# Altium footprint library Tomra_Cadstar_Footprints.PcbLib: 373 footprints (part 23 of 24)
Each footprint in its own frame and in the unit in brackets; x right, y up, seen from the top. Pads: shape width x height; smd on the part's side, far side on the other; paste and mask are expansions set on the pad; w line width, h text height; cw(c..) or ccw(c..) is an arc to the next point about the centre after c.
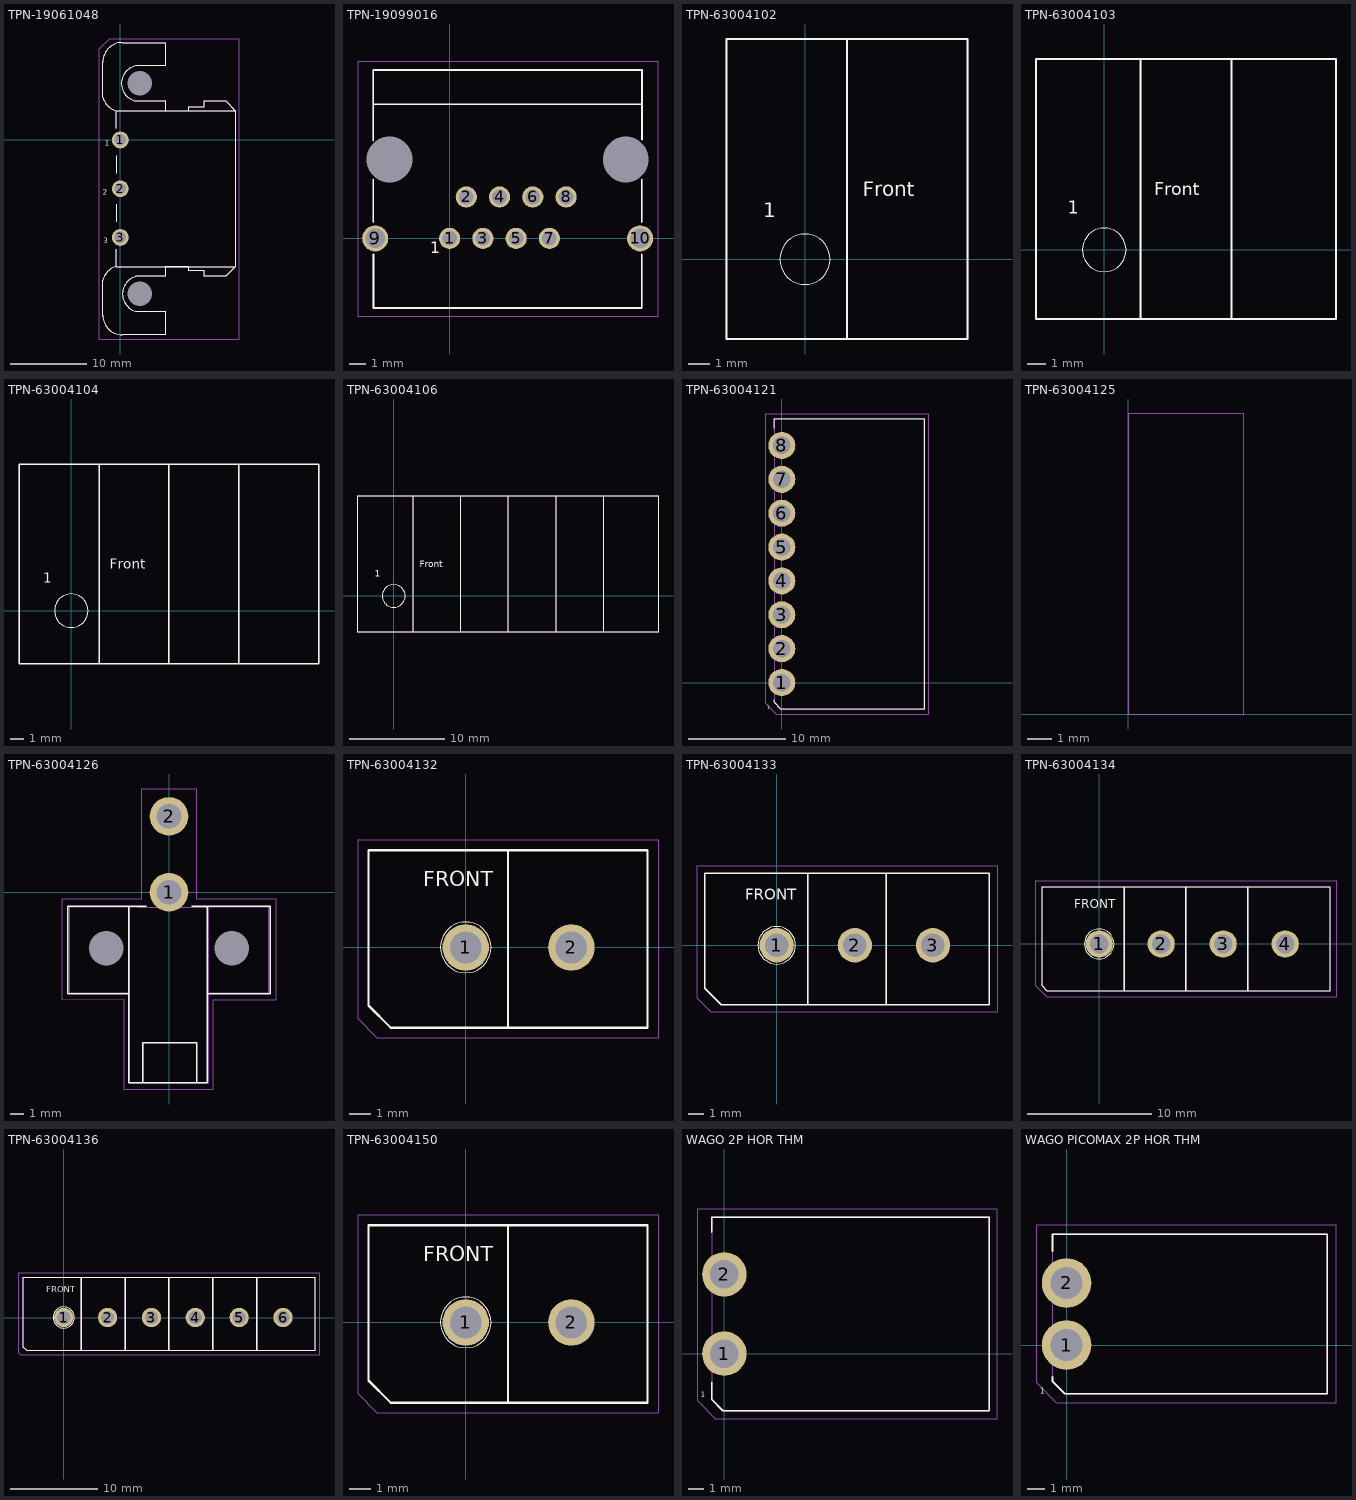
[diagram p22: the footprints below, top view; thin cyan lines are the x and y axes]

## TPN-19061048 [mm]
height 9
pads (5):
  round 2.2 / inner round 1.524 / far side round 2.2 hole 1.5 paste+0 mask+0: 1(0,0) 2(0,-6.35) 3(0,-12.7)
  round 0 / inner round 1.524 / far side round 0 hole 3.2 unplated paste+0 mask+0: 4(2.54,-20.066) 5(2.54,7.366)
Top Silk:
  lines w0.1: -0.508,-14.224 -0.508,-16.51 ; -0.508,-10.668 -0.508,-8.382 ; -0.508,-4.318 -0.508,-2.032 ; -0.508,1.524 -0.508,3.81 ; -0.508,-16.51 14.986,-16.51 ; -0.508,-16.51 ccw(c0,-18.796) -2.286,-18.288 -2.286,-22.86 ccw(c0.254,-22.86) 0.254,-25.4 5.842,-25.4 5.842,-22.352 2.032,-22.352 cw(c2.646,-20.066) 2.032,-17.78 5.842,-17.78 5.842,-16.51 8.89,-16.51 8.89,-17.018 10.922,-17.018 10.922,-17.78 13.716,-17.78 14.986,-16.51 ; -0.508,3.81 14.986,3.81 ; -0.508,3.81 cw(c0,6.096) -2.286,5.588 -2.286,10.16 cw(c0.254,10.16) 0.254,12.7 5.842,12.7 5.842,9.652 2.032,9.652 ccw(c2.455,7.366) 2.032,5.08 5.842,5.08 5.842,3.81 8.89,3.81 8.89,4.318 10.922,4.318 10.922,5.08 13.716,5.08 14.986,3.81 ; 14.986,-16.51 14.986,3.81
  text "3" at -2.26,-13.49 h0.7
  text "1" at -2.032,-0.762 h0.7
  text "2" at -2.286,-7.112 h0.7
  text ".Designator" at 0,0 h0.7
Top Assembly:
  lines w0.05: -0.508,-14.224 -0.508,-16.51 ; -0.508,-10.668 -0.508,-8.382 ; -0.508,-4.318 -0.508,-2.032 ; -0.508,1.524 -0.508,3.81 ; -0.508,-16.51 14.986,-16.51 ; -0.508,-16.51 ccw(c0,-18.796) -2.286,-18.288 -2.286,-22.86 ccw(c0.254,-22.86) 0.254,-25.4 5.842,-25.4 5.842,-22.352 2.032,-22.352 cw(c2.646,-20.066) 2.032,-17.78 5.842,-17.78 5.842,-16.51 8.89,-16.51 8.89,-17.018 10.922,-17.018 10.922,-17.78 13.716,-17.78 14.986,-16.51 ; -0.508,3.81 14.986,3.81 ; -0.508,3.81 cw(c0,6.096) -2.286,5.588 -2.286,10.16 cw(c0.254,10.16) 0.254,12.7 5.842,12.7 5.842,9.652 2.032,9.652 ccw(c2.455,7.366) 2.032,5.08 5.842,5.08 5.842,3.81 8.89,3.81 8.89,4.318 10.922,4.318 10.922,5.08 13.716,5.08 14.986,3.81 ; 14.986,-16.51 14.986,3.81
  text "1" at -2.032,-0.762 h0.35
  text "2" at -2.286,-7.112 h0.35
  text "3" at -2.26,-13.49 h0.35
Top Placement:
  lines w0.01: -2.81,-25.94 15.49,-25.94 15.49,13.16 -1.46,13.16 -2.81,11.81 -2.81,-25.94
  text "1" at -2.032,-0.762 h0.35
  text "2" at -2.286,-7.112 h0.35
  text "3" at -2.26,-13.49 h0.35

## TPN-19099016 [mm]
height 14.75
pads (12):
  round 1.3 / inner round 1.524 / far side round 1.3 hole 0.9 paste+0 mask+0: 1(0,0) 2(1.02,2.54) 3(2.04,0) 4(3.06,2.54) 5(4.08,0) 6(5.1,2.54) 7(6.12,0) 8(7.14,2.54)
  round 1.6 / inner round 1.524 / far side round 1.6 hole 1.2 paste+0 mask+0: 9(-4.565,0) 10(11.685,0)
  round 0 / inner round 1.524 / far side round 0 hole 2.8 unplated paste+0 mask+0: 11(-3.69,4.84) 12(10.81,4.84)
Top Silk:
  lines w0.1: -4.68,0.98 -4.68,3.63 ; -4.68,5.99 -4.68,10.33 11.8,10.33 11.8,6.04 ; -4.67,-0.98 -4.67,-4.27 11.79,-4.27 11.79,-0.98 ; -4.66,8.22 11.79,8.22 ; 11.79,0.98 11.79,3.63
  text "1" at -1.18,-0.91 h0.7
  text ".Designator" at 0,0 h0.7
Top Assembly:
  lines w0.05: -4.68,0.98 -4.68,3.63 ; -4.68,5.99 -4.68,10.33 11.8,10.33 11.8,6.04 ; -4.67,-0.98 -4.67,-4.27 11.79,-4.27 11.79,-0.98 ; -4.66,8.22 11.79,8.22 ; 11.79,0.98 11.79,3.63
  text "1" at -1.18,-0.91 h0.7
Top Placement:
  lines w0.01: -5.62,-4.77 12.78,-4.77 12.78,10.83 -5.62,10.83 -5.62,-4.77

## TPN-63004102 [mm]
height 13
Top Silk:
  lines w0.01: 0,-1.2 cw(c0,0) 0,1.2 cw(c0,0) 0,-1.2
  lines w0.1: 2,-3.75 2,10.5 ; -3.75,-3.8 7.75,-3.8 7.75,10.5 -3.75,10.5 -3.75,-3.8
  text "Front" at 2.75,3 h0.7
  text "1" at -2,2 h0.7
  text ".Designator" at 0,0 h0.7
Top Assembly:
  lines w0.05: 2,-3.75 2,10.5 ; -3.75,-3.8 7.75,-3.8 7.75,10.5 -3.75,10.5 -3.75,-3.8
Top Placement:
  lines w0.01: -3.75,-3.8 7.75,-3.8 7.75,10.5 -3.75,10.5 -3.75,-3.8

## TPN-63004103 [mm]
height 13
Top Silk:
  lines w0.01: 0,-1.2 cw(c0,0) 0,1.2 cw(c0,0) 0,-1.2
  lines w0.1: 2,-3.75 2,10.5 ; 7,-3.75 7,10.5 ; -3.75,-3.8 12.75,-3.8 12.75,10.5 -3.75,10.5 -3.75,-3.8
  text "1" at -2,2 h0.7
  text "Front" at 2.75,3 h0.7
  text ".Designator" at 0,0 h0.7
Top Assembly:
  lines w0.05: 2,-3.75 2,10.5 ; 7,-3.75 7,10.5 ; -3.75,-3.8 12.75,-3.8 12.75,10.5 -3.75,10.5 -3.75,-3.8
Top Placement:
  lines w0.01: -3.75,-3.8 12.75,-3.8 12.75,10.5 -3.75,10.5 -3.75,-3.8

## TPN-63004104 [mm]
height 13
Top Silk:
  lines w0.01: 0,-1.2 cw(c0,0) 0,1.2 cw(c0,0) 0,-1.2
  lines w0.1: 2,-3.75 2,10.5 ; 7,-3.75 7,10.5 ; 12,-3.75 12,10.5 ; -3.75,-3.8 17.75,-3.8 17.75,10.5 -3.75,10.5 -3.75,-3.8
  text "Front" at 2.75,3 h0.7
  text "1" at -2,2 h0.7
  text ".Designator" at 0,0 h0.7
Top Assembly:
  lines w0.05: 2,-3.75 2,10.5 ; 7,-3.75 7,10.5 ; 12,-3.75 12,10.5 ; -3.75,-3.8 17.75,-3.8 17.75,10.5 -3.75,10.5 -3.75,-3.8
Top Placement:
  lines w0.01: -3.75,-3.8 17.75,-3.8 17.75,10.5 -3.75,10.5 -3.75,-3.8

## TPN-63004106 [mm]
height 13
Top Silk:
  lines w0.01: 0,-1.2 cw(c0,0) 0,1.2 cw(c0,0) 0,-1.2
  lines w0.1: 2,-3.75 2,10.5 ; 7,-3.75 7,10.5 ; 12,-3.75 12,10.5 ; 17,-3.75 17,10.5 ; 22,-3.75 22,10.5 ; -3.75,-3.8 27.75,-3.8 27.75,10.5 -3.75,10.5 -3.75,-3.8
  text "Front" at 2.75,3 h0.7
  text "1" at -2,2 h0.7
  text ".Designator" at 0,0 h0.7
Top Assembly:
  lines w0.05: 2,-3.75 2,10.5 ; 7,-3.75 7,10.5 ; 12,-3.75 12,10.5 ; 17,-3.75 17,10.5 ; 22,-3.75 22,10.5 ; -3.75,-3.8 27.75,-3.8 27.75,10.5 -3.75,10.5 -3.75,-3.8
Top Placement:
  lines w0.01: -3.75,-3.8 27.75,-3.8 27.75,10.5 -3.75,10.5 -3.75,-3.8

## TPN-63004121 [mm]
height 12.4
pads (8):
  round 2.8 / inner round 1.524 / far side round 2.8 hole 1.8 paste+0 mask+0: 1(0,0) 2(0,3.5) 3(0,7) 4(0,10.5) 5(0,14) 6(0,17.5) 7(0,21) 8(0,24.5)
Top Silk:
  lines w0.1: -0.8,-1.8 -0.8,-2.05 -0.1,-2.75 14.7,-2.75 14.7,27.25 -0.8,27.25 -0.8,26.3
  text "1" at -1.5,-2.75 h0.35
  text ".Designator" at 0,0 h0.7
Top Assembly:
  lines w0.05: -0.8,-2 -0.05,-2.75 14.7,-2.75 14.7,27.25 -0.8,27.25 -0.8,-2
Top Placement:
  lines w0.01: -1.725,-2.1 -0.575,-3.25 15.2,-3.25 15.2,27.75 -1.725,27.75 -1.725,-2.1

## TPN-63004125 [mm]
height 11
Top Silk:
  text ".Designator" at 0,0 h0.7
Top Placement:
  lines w0.01: 0,0 4.7,0 4.7,12.16 0,12.16 0,0

## TPN-63004126 [mm]
pads (4):
  round 2.8 / inner round 1.524 / far side round 2.8 hole 1.8 paste+0 mask+0: 1(0,0) 2(0,5.512)
  round 0 / inner round 1.524 / far side round 0 hole 2.5 unplated paste+0 mask+0: 3(-4.572,-4.064) 4(4.572,-4.064)
Top Silk:
  lines w0.1: -2.921,-1.016 -2.921,-7.366 ; -1.905,-13.843 -1.905,-10.922 2.032,-10.922 2.032,-13.843 ; -1.651,-1.016 -7.366,-1.016 -7.366,-7.366 -2.921,-7.366 ; 1.651,-1.016 7.366,-1.016 7.366,-7.366 2.794,-7.366 ; 2.794,-1.016 2.794,-7.366 ; -2.921,-7.366 -2.921,-13.843 2.794,-13.843 2.794,-7.366
  text ".Designator" at 0,0 h0.7
Top Assembly:
  lines w0.05: -2.845,-7.29 -7.239,-7.29 -7.239,-1.092 -2.286,-1.092 2.845,-1.092 2.845,-13.894 -2.845,-13.894 -2.845,-1.092 ; -1.905,-13.716 -1.905,-10.922 2.032,-10.922 2.032,-13.843 ; 2.286,-1.092 7.264,-1.092 7.264,-7.29 2.819,-7.29
Top Placement:
  lines w0.01: -7.8,-7.8 -7.8,-0.5 -2,-0.5 -2,7.5 2,7.5 2,-0.5 7.8,-0.5 7.8,-7.8 3.2,-7.8 3.2,-14.3 -3.3,-14.3 -3.3,-7.796 -7.8,-7.8

## TPN-63004132 [mm]
height 13
pads (2):
  round 2.2 / inner round 1.524 / far side round 2.2 hole 1.5 paste+0 mask+0: 1(0,0) 2(5,0)
Top Silk:
  lines w0.01: 0,-1.2 cw(c0,0) 0,1.2 cw(c0,0) 0,-1.2
  lines w0.1: 2,-3.8 8.6,-3.8 8.6,4.6 2,4.6 ; 2,-3.8 2,4.6 ; 2,-3.8 2,4.6 ; 2,-3.8 -3.55,-3.8 -4.6,-2.75 -4.6,4.6 2,4.6
  text "FRONT" at -2,2.9 h0.7
  text ".Designator" at 0,0 h0.7
Top Assembly:
  lines w0.05: 2,-3.8 8.6,-3.8 8.6,4.6 2,4.6 ; 2,-3.8 2,4.6 ; 2,-3.8 2,4.6 ; 2,-3.8 -3.55,-3.8 -4.6,-2.75 -4.6,4.6 2,4.6
  text "1" at -2.1,6.5 h0.7
Top Placement:
  lines w0.01: -5.1,-3.385 -4.185,-4.3 9.1,-4.3 9.1,5.1 -5.1,5.1 -5.1,-3.385
  text "1" at -2.1,6.5 h0.7

## TPN-63004133 [mm]
height 13
pads (3):
  round 2.2 / inner round 1.524 / far side round 2.2 hole 1.5 paste+0 mask+0: 1(0,0) 2(5,0) 3(10,0)
Top Silk:
  lines w0.01: 0,-1.2 cw(c0,0) 0,1.2 cw(c0,0) 0,-1.2
  lines w0.1: 2,-3.8 7,-3.8 ; 2,-3.8 2,4.6 ; 2,-3.8 2,4.6 ; 2,-3.8 -3.55,-3.8 -4.6,-2.75 -4.6,4.6 2,4.6 ; 2,4.6 7,4.6 ; 7,-3.8 7,4.6 ; 7,-3.8 13.6,-3.8 13.6,4.6 7,4.6 ; 7,-3.8 7,4.6
  text "FRONT" at -2,2.9 h0.7
  text ".Designator" at 0,0 h0.7
Top Assembly:
  lines w0.05: 2,-3.8 7,-3.8 ; 2,-3.8 2,4.6 ; 2,-3.8 2,4.6 ; 2,-3.8 -3.55,-3.8 -4.6,-2.75 -4.6,4.6 2,4.6 ; 2,4.6 7,4.6 ; 7,-3.8 7,4.6 ; 7,-3.8 13.6,-3.8 13.6,4.6 7,4.6 ; 7,-3.8 7,4.6
  text "1" at -2.1,6.5 h0.7
Top Placement:
  lines w0.01: -5.1,-3.385 -4.185,-4.3 14.1,-4.3 14.1,5.1 -5.1,5.1 -5.1,-3.385
  text "1" at -2.1,6.5 h0.7

## TPN-63004134 [mm]
height 13
pads (4):
  round 2.2 / inner round 1.524 / far side round 2.2 hole 1.5 paste+0 mask+0: 1(0,0) 2(5,0) 3(10,0) 4(15,0)
Top Silk:
  lines w0.01: 0,-1.2 cw(c0,0) 0,1.2 cw(c0,0) 0,-1.2
  lines w0.1: 2,-3.8 7,-3.8 ; 2,-3.8 2,4.6 ; 2,-3.8 2,4.6 ; 2,-3.8 -4.185,-3.8 -4.6,-3.385 -4.6,4.6 2,4.6 ; 2,4.6 7,4.6 ; 7,-3.8 12,-3.8 ; 7,-3.8 7,4.6 ; 7,-3.8 7,4.6 ; 7,4.6 12,4.6 ; 12,-3.8 12,4.6 ; 12,-3.8 18.6,-3.8 18.6,4.6 12,4.6 ; 12,-3.8 12,4.6
  text "FRONT" at -2,2.9 h0.7
  text ".Designator" at 0,0 h0.7
Top Assembly:
  lines w0.05: 2,-3.8 7,-3.8 ; 2,-3.8 2,4.6 ; 2,-3.8 2,4.6 ; 2,-3.8 -4.185,-3.8 -4.6,-3.385 -4.6,4.6 2,4.6 ; 2,4.6 7,4.6 ; 7,-3.8 12,-3.8 ; 7,-3.8 7,4.6 ; 7,-3.8 7,4.6 ; 7,4.6 12,4.6 ; 12,-3.8 12,4.6 ; 12,-3.8 18.6,-3.8 18.6,4.6 12,4.6 ; 12,-3.8 12,4.6
  text "1" at -2.1,6.5 h0.7
Top Placement:
  lines w0.01: -5.1,-3.385 -4.185,-4.3 19.1,-4.3 19.1,5.1 -5.1,5.1 -5.1,-3.385
  text "1" at -2.1,6.5 h0.7

## TPN-63004136 [mm]
height 13
pads (6):
  round 2.2 / inner round 1.524 / far side round 2.2 hole 1.5 paste+0 mask+0: 1(0,0) 2(5,0) 3(10,0) 4(15,0) 5(20,0) 6(25,0)
Top Silk:
  lines w0.01: 0,-1.2 cw(c0,0) 0,1.2 cw(c0,0) 0,-1.2
  lines w0.1: 2,-3.8 7,-3.8 ; 2,-3.8 2,4.6 ; 2,-3.8 2,4.6 ; 2,-3.8 -4.185,-3.8 -4.6,-3.385 -4.6,4.6 2,4.6 ; 2,4.6 7,4.6 ; 7,-3.8 12,-3.8 ; 7,-3.8 7,4.6 ; 7,-3.8 7,4.6 ; 7,4.6 12,4.6 ; 12,-3.8 17,-3.8 ; 12,-3.8 12,4.6 ; 12,-3.8 12,4.6 ; 12,4.6 17,4.6 ; 17,-3.8 22,-3.8 ; 17,-3.8 17,4.6 ; 17,-3.8 17,4.6 ; 17,4.6 22,4.6 ; 22,-3.8 22,4.6 ; 22,-3.8 28.6,-3.8 28.6,4.6 22,4.6 ; 22,-3.8 22,4.6
  text "FRONT" at -2,2.9 h0.7
  text ".Designator" at 0,0 h0.7
Top Assembly:
  lines w0.05: 2,-3.8 7,-3.8 ; 2,-3.8 2,4.6 ; 2,-3.8 2,4.6 ; 2,-3.8 -4.185,-3.8 -4.6,-3.385 -4.6,4.6 2,4.6 ; 2,4.6 7,4.6 ; 7,-3.8 12,-3.8 ; 7,-3.8 7,4.6 ; 7,-3.8 7,4.6 ; 7,4.6 12,4.6 ; 12,-3.8 17,-3.8 ; 12,-3.8 12,4.6 ; 12,-3.8 12,4.6 ; 12,4.6 17,4.6 ; 17,-3.8 22,-3.8 ; 17,-3.8 17,4.6 ; 17,-3.8 17,4.6 ; 17,4.6 22,4.6 ; 22,-3.8 22,4.6 ; 22,-3.8 28.6,-3.8 28.6,4.6 22,4.6 ; 22,-3.8 22,4.6
  text "1" at -2.1,6.5 h0.7
Top Placement:
  lines w0.01: -5.1,-4.02 -4.82,-4.3 29.1,-4.3 29.1,5.1 -5.1,5.1 -5.1,-4.02
  text "1" at -2.1,6.5 h0.7

## TPN-63004150 [mm]
height 13
pads (2):
  round 2.2 / inner round 1.524 / far side round 2.2 hole 1.5 paste+0 mask+0: 1(0,0) 2(5,0)
Top Silk:
  lines w0.01: 0,-1.2 cw(c0,0) 0,1.2 cw(c0,0) 0,-1.2
  lines w0.1: 2,-3.8 8.6,-3.8 8.6,4.6 2,4.6 ; 2,-3.8 2,4.6 ; 2,-3.8 2,4.6 ; 2,-3.8 -3.55,-3.8 -4.6,-2.75 -4.6,4.6 2,4.6
  text "FRONT" at -2,2.9 h0.7
  text ".Designator" at 0,0 h0.7
Top Assembly:
  lines w0.05: 2,-3.8 8.6,-3.8 8.6,4.6 2,4.6 ; 2,-3.8 2,4.6 ; 2,-3.8 2,4.6 ; 2,-3.8 -3.55,-3.8 -4.6,-2.75 -4.6,4.6 2,4.6
  text "1" at -2.1,6.5 h0.7
Top Placement:
  lines w0.01: -5.1,-3.385 -4.185,-4.3 9.1,-4.3 9.1,5.1 -5.1,5.1 -5.1,-3.385
  text "1" at -2.1,6.5 h0.7

## WAGO 2P HOR THM [mm]
height 12.4
pads (2):
  round 2.8 / inner round 1.524 / far side round 2.8 hole 1.8 paste+0 mask+0: 1(0,0) 2(0,5)
Top Silk:
  lines w0.1: -0.8,-1.8 -0.8,-2.9 -0.1,-3.6 16.7,-3.6 16.7,8.6 -0.8,8.6 -0.8,7.65
  text "1" at -1.5,-2.75 h0.35
  text ".Designator" at 0,0 h0.7
Top Assembly:
  lines w0.05: -0.8,-2.85 -0.05,-3.6 16.7,-3.6 16.7,8.6 -0.8,8.6 -0.8,-2.85
Top Placement:
  lines w0.01: -1.725,-2.95 -0.575,-4.1 17.2,-4.1 17.2,9.1 -1.725,9.1 -1.725,-2.95

## WAGO PICOMAX 2P HOR THM [mm]
height 12.4
pads (2):
  round 2.8 / inner round 1.524 / far side round 2.8 hole 1.8 paste+0 mask+0: 1(0,0) 2(0,3.5)
Top Silk:
  lines w0.1: -0.8,-1.8 -0.8,-2.05 -0.1,-2.75 14.7,-2.75 14.7,6.25 -0.8,6.25 -0.8,5.3
  text "1" at -1.5,-2.75 h0.35
  text ".Designator" at 0,0 h0.7
Top Assembly:
  lines w0.05: -0.8,-2 -0.05,-2.75 14.7,-2.75 14.7,6.25 -0.8,6.25 -0.8,-2
Top Placement:
  lines w0.01: -1.725,-2.1 -0.575,-3.25 15.2,-3.25 15.2,6.75 -1.725,6.75 -1.725,-2.1